# Altium footprint library Conectors.PcbLib: 122 footprints (part 6 of 8)
Each footprint in its own frame and in the unit in brackets; x right, y up, seen from the top. Pads: shape width x height; smd on the part's side, far side on the other; paste and mask are expansions set on the pad; w line width, h text height; cw(c..) or ccw(c..) is an arc to the next point about the centre after c.
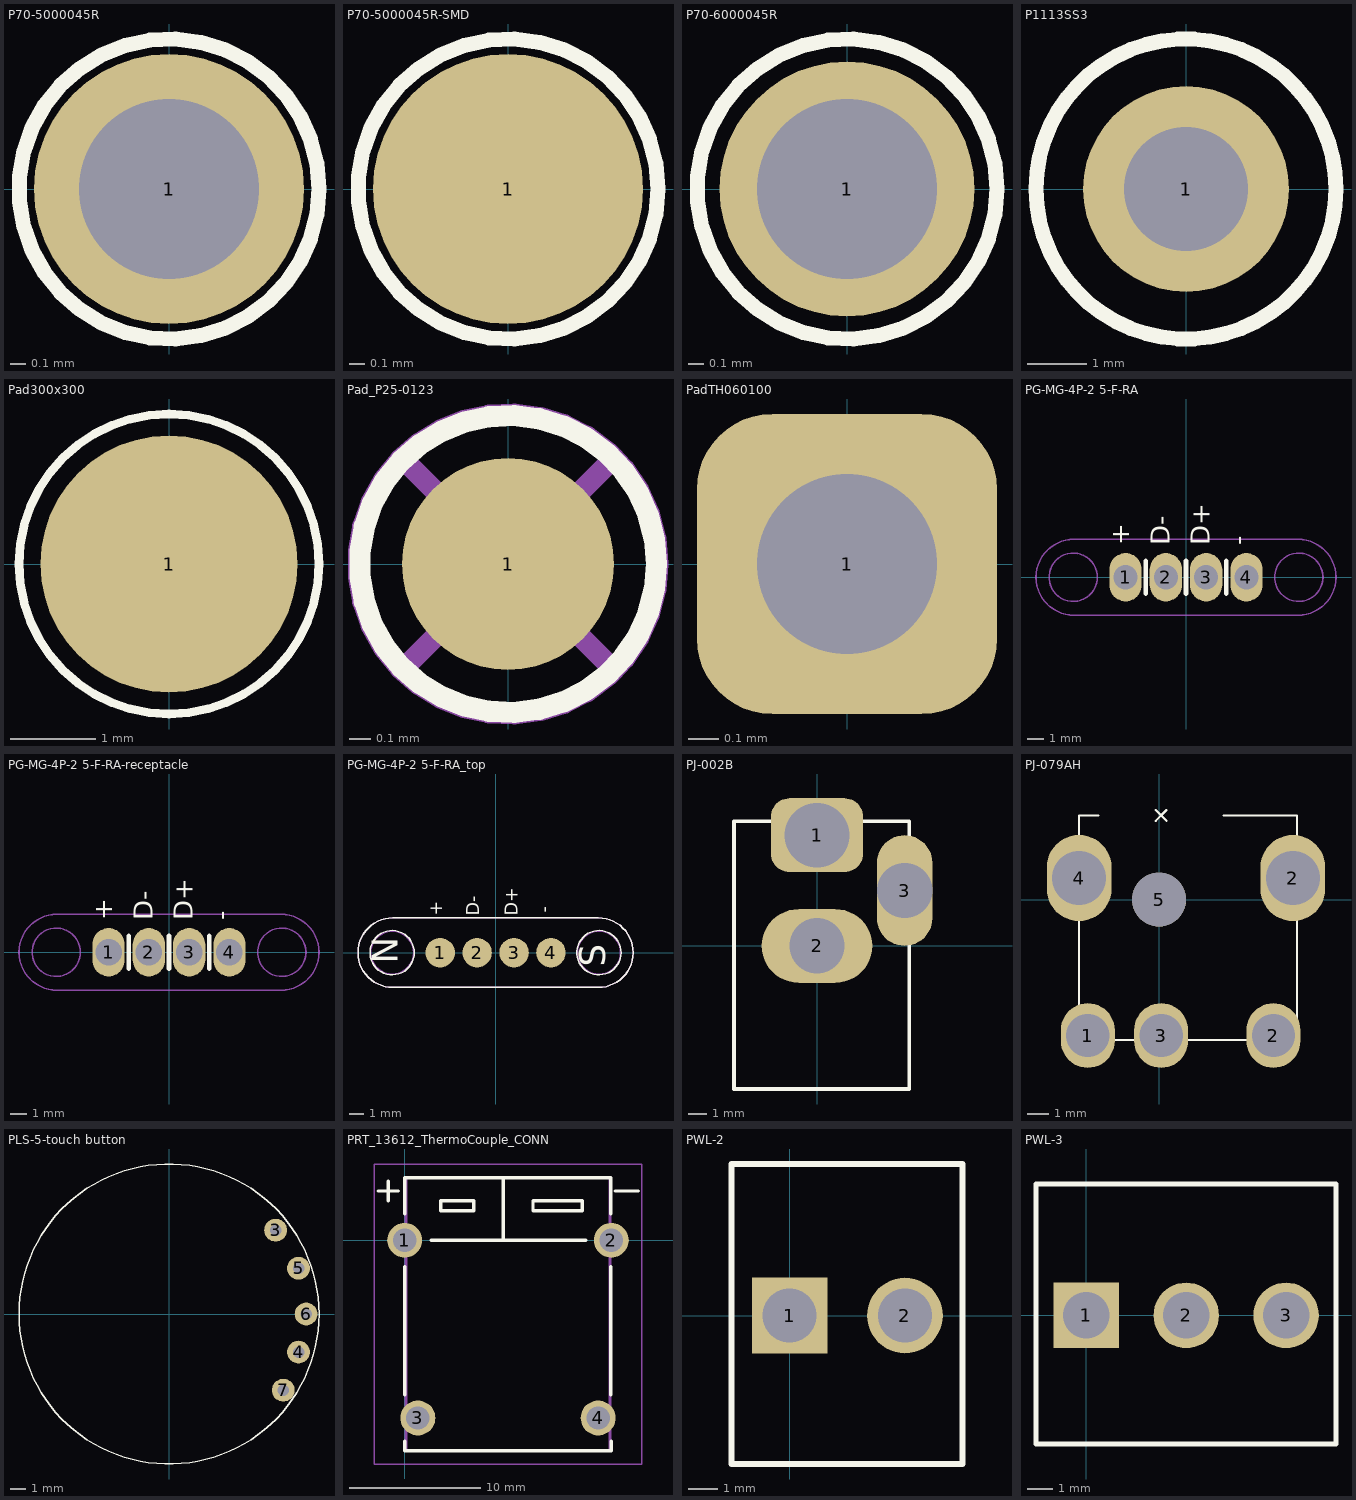
[diagram p5: the footprints below, top view; thin cyan lines are the x and y axes]

## P70-5000045R [mm]
pads (1):
  round 1.8 hole 1.2: 1(0,0)
Top Overlay:
  circle w0.1: c0,0 r1
3D body: height 1.55, standoff -0.85, extent -0.297,-0.299 0.3,0.3
3D body: height 0.93, standoff -0.85, extent -0.511,-0.514 0.515,0.514
3D body: height -0.45, standoff -0.85, extent -0.744,-0.748 0.75,0.749

## P70-5000045R-SMD [mm]
height 2.4
pads (1):
  round 1.8 smd: 1(0,0)
Top Overlay:
  circle w0.1: c0,0 r1
3D body: height 0.4, standoff 0, extent -0.744,-0.748 0.75,0.749
3D body: height 1.78, standoff 0, extent -0.511,-0.514 0.515,0.514
3D body: height 2.4, standoff 0, extent -0.297,-0.299 0.3,0.3

## P70-6000045R [mm]
pads (1):
  round 1.7 hole 1.2: 1(0,0)
Top Overlay:
  circle w0.1: c0,0 r1
3D body: height 0, standoff 0, extent -0.496,-0.499 0.5,0.499
3D body: height 0.4, standoff 0, extent -0.744,-0.748 0.75,0.749
3D body: height 1.85, standoff 0, extent -0.565,-0.569 0.57,0.569
3D body: height 2.8, standoff 0, extent -0.173,-0.175 0.175,0.175

## P1113SS3 [mm]
pads (1):
  round 3.5 hole 2.1: 1(0,0)
Top Overlay:
  circle w0.254: c0,0 r2.55
3D body "Pogopin_P1113SS3 v4.step": height 20.98, standoff -6.02, extent -1.275,-1.266 1.275,1.266

## Pad300x300 [mm]
pads (1):
  round 3 smd: 1(0,0)
Top Overlay:
  circle w0.1: c0,0 r1.75

## Pad_P25-0123 [mm]
pads (1):
  round 1 smd: 1(0,0)
Top Overlay:
  circle w0.1: c0,0 r0.7
Mechanical 15:
  circle w0.1: c0,0 r0.707
  lines w0.1: -0.5,-0.5 0.5,0.5 ; -0.5,0.5 0.5,-0.5

## PadTH060100 [mm]
pads (1):
  rrect50% 1x1 hole 0.6: 1(0,0)

## PG-MG-4P-2 5-F-RA [mm]
pads (4):
  oval 2x3 / inner round 2 / far side round 2 hole 1.5: 1(-3.75,0) 2(-1.25,0) 3(1.25,0) 4(3.75,0)
Top Overlay:
  lines w0.3: -2.5,-1 -2.5,1 ; 0,-1 0,1 ; 2.5,-1 2.5,1
  text "+" at -3.12,2 h2
  text "D-" at -0.609,2 h2
  text "D+" at 1.891,2 h2
  text "-" at 4.214,2 h2
Mechanical 15:
  circle w0.1: c-7,0 r1.5
  circle w0.1: c7,0 r1.5
  lines w0.1: -6.955,-2.355 cw(c-6.955,0) -6.955,2.355 6.955,2.355 cw(c6.955,0) 6.955,-2.355 -6.955,-2.355
  text "N" at -6.359,-0.505 h2
  text "S" at 7.641,-0.509 h2
3D body: height 4.5, standoff 1.5, extent 5.55,-1.45 8.45,1.45
3D body: height 4.5, standoff 1.5, extent -8.45,-1.45 -5.55,1.45

## PG-MG-4P-2 5-F-RA-receptacle [mm]
pads (4):
  oval 2x3 / inner round 2 / far side oval 2x3 hole 1.65: 1(-3.75,0) 2(-1.25,0) 3(1.25,0) 4(3.75,0)
Top Overlay:
  lines w0.3: -2.5,-1 -2.5,1 ; 0,-1 0,1 ; 2.5,-1 2.5,1
  text "+" at -3.12,2 h2
  text "D-" at -0.609,2 h2
  text "D+" at 1.891,2 h2
  text "-" at 4.214,2 h2
Bottom Overlay:
  lines w0.3: -2.5,-1 -2.5,1 ; 0,-1 0,1 ; 2.5,-1 2.5,1
Mechanical 15:
  circle w0.1: c-7,0 r1.5
  circle w0.1: c7,0 r1.5
  lines w0.1: -6.955,-2.355 cw(c-6.955,0) -6.955,2.355 6.955,2.355 cw(c6.955,0) 6.955,-2.355 -6.955,-2.355
  text "N" at -6.359,-0.505 h2
  text "S" at 7.641,-0.509 h2
3D body: height 4.5, standoff 1.5, extent 5.55,-1.45 8.45,1.45
3D body: height 4.5, standoff 1.5, extent -8.45,-1.45 -5.55,1.45
3D body "0287-0-15-15-16-27-10-0.step": height 1.19, standoff -1.09, extent -4.754,-1.015 -2.722,1.002
3D body "0287-0-15-15-16-27-10-0.step": height 1.19, standoff -1.09, extent -2.254,-1.015 -0.222,1.002
3D body "0287-0-15-15-16-27-10-0.step": height 1.19, standoff -1.09, extent 0.246,-1.015 2.278,1.002
3D body "0287-0-15-15-16-27-10-0.step": height 1.19, standoff -1.09, extent 2.746,-1.015 4.778,1.002

## PG-MG-4P-2 5-F-RA_top [mm]
pads (4):
  round 2 smd: 1(-3.75,0) 2(-1.25,0) 3(1.25,0) 4(3.75,0)
Top Overlay:
  circle w0.1: c-7,0 r1.5
  circle w0.1: c7,0 r1.5
  lines w0.1: -6.955,-2.355 cw(c-6.955,0) -6.955,2.355 6.955,2.355 cw(c6.955,0) 6.955,-2.355 -6.955,-2.355
  text "S" at 7.994,-0.963 h3
  text "-" at 4,2.7 h1.5
  text "D+" at 1.8,2.5 h1.5
  text "D-" at -0.8,2.5 h1.5
  text "+" at -3.3,2.5 h1.5
  text "N" at -6.039,-0.757 h3
Mechanical 13:
  circle w0.1: c7,0 r1.45
  circle w0.1: c-7,0 r1.45
Mechanical 15:
  lines w0.1: -6.955,-2.355 cw(c-6.955,0) -6.955,2.355 6.955,2.355 cw(c6.955,0) 6.955,-2.355 -6.955,-2.355
3D body: height 0.15, standoff -3, extent -8.45,-1.45 -5.55,1.45
3D body: height 0.15, standoff -3, extent 5.55,-1.45 8.45,1.45

## PJ-002B [mm] "2.5 mm Center Pin 2.5 A Right Angle Through Hole Dc Power Jack Connector"
height 11
pads (3):
  rrect50% 5x4 hole 3.5: 1(0,6)
  oval 6x4 hole 3: 2(0,0)
  oval 3x6 hole 3: 3(4.75,3)
Top Overlay:
  lines w0.2: -4.5,-7.75 -4.5,6.75 5,6.75 5,-7.75 -4.5,-7.75
3D body "pj-002b.stp": height 11.5, standoff -3, extent -4.4,-7.7 5,6.7

## PJ-079AH [mm]
height 7.3
pads (6):
  oval 2.5x3 hole 2: 1(-3.3,-6.3) 2(5.3,-6.3) 3(0.1,-6.3)
  oval 3x4 hole 2.5: 2(6.2,1) 4(-3.7,1)
  round 2.5 hole 2.5: 5(0,0)
Top Overlay:
  lines w0.1: -3.7,-7.6 -3.7,3.9 -2.8,3.9 ; -3.7,-6.5 6.4,-6.5 6.4,3.9 3,3.9 ; -0.15,3.65 0.35,4.15 ; -0.15,4.15 0.35,3.65
3D body "CUI_DEVICES_PJ-079AH.step": height 7.95, standoff -1.83, extent -3.67,-7.825 6.4,3.825

## PLS-5-touch button [mil]
pads (5):
  round 60 hole 30: 3(280,220) 4(340,-100) 5(340,120) 6(360,0) 7(300,-200)
Top Overlay:
  circle w3.94: c0,0 r393.7

## PRT_13612_ThermoCouple_CONN [mm]
pads (4):
  round 2.655 hole 1.77: 1(0,0) 2(15.7,0) 3(1,-13.5) 4(14.7,-13.5)
Top Overlay:
  lines w0.254: -2,3.75 -0.5,3.75 ; -1.25,3 -1.25,4.5 ; 0,-15.25 0,-16 15.7,-16 15.7,-15.25 ; 0,-11.75 0,-2 ; 0,2 0,4.75 15.65,4.75 15.65,2 ; 7.5,4.75 7.5,0 2,0 13.75,0 ; 10,3 9.75,3 ; 15.65,-11.75 15.65,-2 ; 16,3.75 17.75,3.75 ; 9.75,3 13.5,3 13.5,2.25 9.75,2.25 9.75,3 ; 2.75,2.25 2.75,3 5.25,3 5.25,2.25 2.75,2.25
Mechanical 13:
  lines w0.2: 0.1,-16 15.6,-16 15.6,4.8 0.1,4.8 0.1,-16
Mechanical 15:
  lines w0.1: -2.328,-17 18.027,-17 18.027,5.8 -2.328,5.8 -2.328,-17
3D body "PCC-SMP.STEP": height 6.96, standoff -4.14, extent 0,-16 15.7,4.8

## PWL-2 [mm] "Connector; Header; 2 Position"
height 0.001
pads (2):
  rect 2.6x2.6 hole 1.85: 1(0,0)
  round 2.6 hole 1.85: 2(3.96,0)
Top Overlay:
  lines w0.2: -2,-5.1 -2,5.207 5.94,5.207 5.94,-5.1 -2,-5.1
3D body "PWL-2.stp": height 13.5, standoff -4, extent -1.98,-5 5.94,5

## PWL-3 [mm] "Connector; Header; 3 Position"
height 0.001
pads (3):
  rect 2.6x2.6 hole 1.85: 1(0,0)
  round 2.6 hole 1.85: 2(3.96,0) 3(7.92,0)
Top Overlay:
  lines w0.2: -2,-5.1 9.9,-5.1 9.9,5.207 -2,5.207 -2,-5.1
3D body "PWL-3.stp": height 13.5, standoff -4, extent -1.98,-5 9.9,5